# Altium footprint library Hydra_Ref_pcb.PcbLib: 353 footprints (part 18 of 23)
Each footprint in its own frame and in the unit in brackets; x right, y up, seen from the top. Pads: shape width x height; smd on the part's side, far side on the other; paste and mask are expansions set on the pad; w line width, h text height; cw(c..) or ccw(c..) is an arc to the next point about the centre after c.
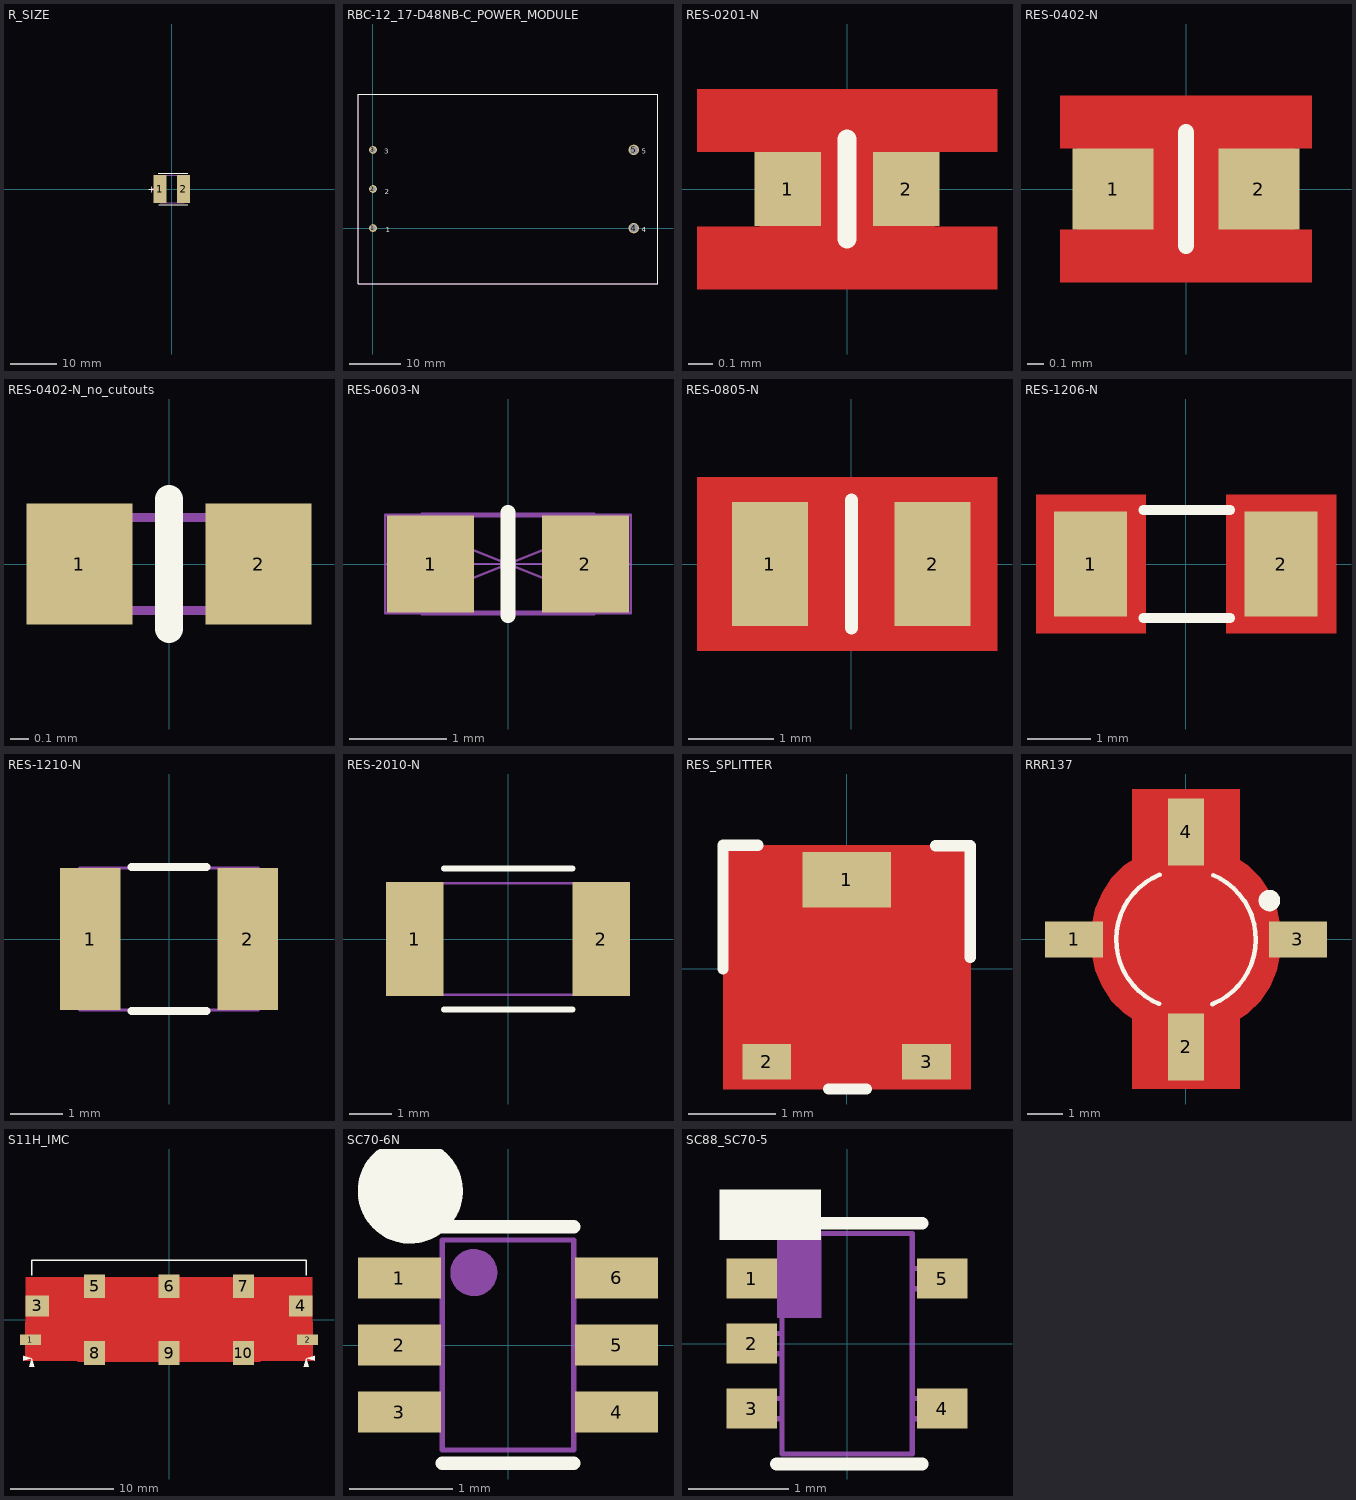
[diagram p17: the footprints below, top view; thin cyan lines are the x and y axes]

## R_SIZE [mil] "TANT CHIP CAP .283x.235x.148 R CASE CODE VISHAY"
height 150
pads (2):
  rect 110x240 smd: 1(-100,0) 2(100,0)
Top Overlay:
  lines w8: -115,132 135,132 ; -112.5,-132 135,-132
  text "+" at -205,-30 h60
9 Top Assy:
  lines w5: -98.15,-118.11 106.3,-118.11 ; -98.15,-118.05 -121.19,-5 -165.35,-5 -165.35,5 -121.73,5 -98.17,118.11 106.66,118.11 ; -78.38,-118.18 ccw(c-682.55,0) -78.35,118.02 ; 78.85,-118.09 cw(c658.22,0.05) 78.83,118.09 ; 106.66,-118.18 ccw(c-497.51,0) 106.66,118.18
  text "+" at -163.39,9.84 h60
  text ".Designator" at 21.65,-106.3 h60
3D body: height 150, standoff 0, extent -180,-140 180,140
3D body: height 80, standoff 50, extent -197.28,-20.16 -177.17,19.68

## RBC-12_17-D48NB-C_POWER_MODULE [mil] "RBC-12/17-D48NB-C"
height 137.8
pads (5):
  round 60 hole 40: 1(0,0) 2(0,300) 3(0,600)
  round 80 hole 60: 4(2000,0) 5(2000,600)
Top Overlay:
  lines w3: -115,-425 -115,1025 2186,1025 2186,-425 247.75,-425 -115,-425
  text "3" at 86,569 h39.37
  text "4" at 2060,-32 h39.37
  text "5" at 2060,569 h39.37
  text "2" at 92,258 h39.37
  text "1" at 97,-32 h39.37
9 Top Assy:
  lines w3: -115,-425 2186,-425 2186,1025 -115,1025 -115,-425
  text ".Designator" at 693,251 h39.37
13 Top 3D Bodies:
  lines w3: -115,-425 2186,-425 2186,1025 -115,1025 -115,-425
3D body: height 35.65, standoff 0, extent -115,-426 2183,1025

## RES-0201-N [mm] "Metric 1005"
height 0.305
pads (2):
  rect 0.27x0.3 smd mask+0.051: 1(-0.24,0) 2(0.24,0)
Top Layer:
  pour cut-out: -0.61,0.406 0.61,0.406 0.61,0.152 0.356,0.152 0.356,-0.152 0.61,-0.152 0.61,-0.406 -0.61,-0.406 -0.61,-0.152 -0.356,-0.152 -0.356,0.152 -0.61,0.152
Top Overlay:
  lines w0.076: 0,-0.203 0,0.203
Top Solder:
  rectangle: -0.24,-0.201 0.24,0.201
9 Top Assy:
  lines w0.038: -0.305,-0.152 0.305,-0.152 0.305,0.152 -0.305,0.152 -0.305,-0.152
  text ".Designator" at -0.254,-0.076 h0.15
3D body: height 0.61, standoff 0.01, extent -0.305,-0.152 0.305,0.152

## RES-0402-N [mil]
height 34
pads (2):
  rect 20x20 smd mask+2: 1(-18,0) 2(18,0)
Top Layer:
  pour cut-out: -31,23 31,23 31,10 27,10 27,-10 31,-10 31,-23 -31,-23 -31,-10 -27,-10 -27,10 -31,10
Top Overlay:
  lines w4: 0,-14 0,14
Top Solder:
  pour cut-out: -37,19 37,19 37,-19 -37,-19
9 Top Assy:
  lines w2: -20,-10 20,-10 20,10 -20,10 -20,-10
  text ".Designator" at -31,23 h10
3D body: height 33.07, standoff 0.39, extent -20,-10 20,10

## RES-0402-N_no_cutouts [mm]
height 0.864
pads (2):
  rect 0.58x0.66 smd: 1(-0.49,0) 2(0.49,0)
Top Overlay:
  lines w0.152: 0,-0.356 0,0.356
9 Top Assy:
  lines w0.051: -0.508,-0.254 0.508,-0.254 0.508,0.254 -0.508,0.254 -0.508,-0.254
  text ".Designator" at -0.45,-0.139 h0.25
3D body: height 0.84, standoff 0.01, extent -1,-0.55 1,0.55

## RES-0603-N [mm]
height 0.84
pads (2):
  rect 0.9x1 smd: 1(-0.8,0) 2(0.8,0)
Top Overlay:
  lines w0.152: 0,-0.533 0,0.533
Top Solder:
  pour cut-out: -1.549,0.787 1.549,0.787 1.549,-0.787 -1.549,-0.787
9 Top Assy:
  lines w0.051: -0.889,-0.508 -0.889,0.508 0.889,0.508 0.889,-0.508 -0.889,-0.508
  text ".Designator" at -0.826,-0.2 h0.47
22 Part Dimentions & Info:
  lines w0.025: -1.27,0 1.27,0 ; -0.826,-0.508 -0.826,0.508 ; 0,-0.508 0,0.508 ; 0.826,-0.508 0.826,0.508 ; -1.27,-0.508 1.27,0.508 ; -1.27,-0.508 -1.27,0.508 ; -1.27,-0.508 1.27,-0.508 ; -1.27,0.508 1.27,-0.508 ; -1.27,0.508 1.27,0.508 ; 1.27,-0.508 1.27,0.508
3D body: height 0.84, standoff 0, extent -0.888,-0.507 0.888,0.507

## RES-0805-N [mm]
height 0.711
pads (2):
  rect 0.889x1.45 smd: 1(-0.95,0) 2(0.95,0)
Top Layer:
  pour cut-out: -1.803,1.016 1.703,1.016 1.703,-1.016 -1.803,-1.016
Top Overlay:
  lines w0.152: 0,-0.75 0,0.75
9 Top Assy:
  lines w0.051: -1.016,-0.762 1.016,-0.762 1.016,0.762 -1.016,0.762 -1.016,-0.762
  text ".Designator" at -0.889,-0.254 h0.51
22 Part Dimentions & Info:
  lines w0.025: -1.524,0 1.524,0 ; -1.016,-0.762 -1.016,0.762 ; 0,-0.762 0,0.762 ; 1.016,-0.762 1.016,0.762 ; -1.524,-0.762 1.524,0.762 ; -1.524,-0.762 1.524,-0.762 ; -1.524,-0.762 -1.524,0.762 ; -1.524,0.762 1.524,-0.762 ; -1.524,0.762 1.524,0.762 ; 1.524,-0.762 1.524,0.762
3D body: height 0.7, standoff 0.01, extent -1.016,-0.762 1.016,0.762

## RES-1206-N [mm] "METRIC 3225"
height 1.7
pads (2):
  rect 1.15x1.65 smd: 1(-1.5,0) 2(1.5,0)
Top Layer:
  pour cut-out: 0.638,1.092 2.365,1.092 2.365,-1.092 0.638,-1.092
  pour cut-out: -2.362,1.092 -0.635,1.092 -0.635,-1.092 -2.362,-1.092
Top Overlay:
  lines w0.152: -0.67,-0.85 0.7,-0.85 ; -0.67,0.85 0.7,0.85
9 Top Assy:
  lines w0.051: -1.7,-0.8 1.7,-0.8 1.7,0.8 -1.7,0.8 -1.7,-0.8
  text ".Designator" at -1.5,-0.4 h0.71
3D body: height 0.64, standoff 0.01, extent -1.7,-0.8 1.7,0.8

## RES-1210-N [mm] "METRIC 3225"
height 0.7
pads (2):
  rect 1.15x2.7 smd: 1(-1.5,0) 2(1.5,0)
Top Overlay:
  lines w0.152: -0.711,-1.372 0.711,-1.372 ; -0.711,1.372 0.711,1.372
9 Top Assy:
  lines w0.051: -1.7,-1.35 -1.7,1.35 1.7,1.35 1.7,-1.35 -1.7,-1.35
  text ".Designator" at -1.5,-0.4 h0.81
3D body: height 0.7, standoff 0, extent -1.699,-1.349 1.699,1.349

## RES-2010-N [mil]
height 28
pads (2):
  rect 54x106.3 smd: 1(-87.5,0) 2(87,0)
Top Overlay:
  lines w6: -60,-66 60,-66 ; -60,66 60,66
Top Solder:
  pour cut-out: -126,65 125,65 125,-65 -126,-65
9 Top Assy:
  lines w2: -101.38,-52.17 -101.38,52.17 101.38,52.17 101.38,-52.17 -101.38,-52.17
  text ".Designator" at -50,-10 h25
3D body: height 24.02, standoff 0, extent -101.38,-52.17 101.38,52.17

## RES_SPLITTER [mil] "IPS2541; 98 X98 MIL"
height 20
pads (3):
  rect 40x25 smd: 1(0,40)
  rect 22x16 smd: 2(-36,-42) 3(36,-42)
Top Layer:
  region: 47,-16.46 46.54,-16 38,-16 25,-35 25,-49 47,-49
  region: -47,-16.46 -46.54,-16 -38,-16 -25,-35 -25,-49 -47,-49
  pour cut-out: -55.7,55.66 56,55.66 56,-54.2 -55.7,-54.2
Top Overlay:
  lines w5: -55.7,0 -55.7,55.66 -40,55.66 ; -8.18,-54.2 8.93,-54.2 ; 40,55.41 55.69,55.41 55.69,5
Top Paste:
  region: 47,-16.46 46.54,-16 38,-16 25,-35 25,-49 47,-49
  region: -47,-16.46 -46.54,-16 -38,-16 -25,-35 -25,-49 -47,-49
Top Solder:
  rectangle: -51,-54 51,57
  rectangle: -30,64 30,81
9 Top Assy:
  lines w2: -27.53,-48.8 -27.53,-40 -40,-19 -44.53,-19 ; -14,49 -14,31 14,31 14,49 ; 27.53,-48.8 27.53,-40 40,-19 44.53,-19 ; -44.53,-19 -44.53,-48.8 -44.53,-19 ; 44.53,-19 44.53,-48.8 44.53,-19 ; -49,-49 -49,49 49,49 49,-49 -49,-49
  text ".Designator" at -38,-5 h20
3D body: height 20, standoff 0.39, extent -49,-49 49,49

## RRR137 [mil]
height 76
pads (4):
  rect 65x40 smd: 1(-125,0) 3(125,0)
  rect 40x75 smd: 2(0,-120) 4(0,120)
Top Layer:
  rectangle: -20,-157 20,157
  region: 0,73 12,72 23,69 37,63 49,54 60,42 60,-42 52,-52 40,-61 26,-68 10,-72 -8,-72 -23.76,-69 -38,-62 -52,-52 -60,-41 -60,42 -51,52 -41,61 -27,68 -15,71 -1,73
  pour cut-out: 5.31,105 15.16,105 34.48,101.16 52.68,93.62 69.06,82.68 82.99,68.75 93.93,52.37 101.47,34.17 105.31,14.85 105.31,5 105.31,-5 105.31,-14.85 101.47,-34.17 93.93,-52.36 82.99,-68.74 69.06,-82.67 52.68,-93.62 34.48,-101.15 15.16,-105 5.31,-105 -5,-105 -14.85,-105 -34.17,-101.15 -52.36,-93.62 -68.74,-82.67 -82.67,-68.74 -93.62,-52.36 -101.15,-34.17 -105,-14.85 -105,-5 -105,5 -105,14.85 -101.15,34.17 -93.62,52.37 -82.67,68.75 -68.74,82.68 -52.36,93.62 -34.17,101.16 -14.85,105 -5,105
  pour cut-out: 60,168 60,-167 -60,-167 -60,168
Top Overlay:
  circle w12: c93.15,43.46 r6
  lines w5: -30,-72 cw(c0,0) -29.21,72.32 ; 29.21,-72.32 ccw(c0,0) 30.21,71.92
9 Top Assy:
  circle w2: c0,0 r73
  circle w2: c45,0 r15
  lines w2: -102.5,-15 -102.5,15 ; -71,-15 -135,-15 -125,15 -71,15 ; -15,-102.5 15,-102.5 ; -15,-71 -15,-135 15,-135 15,-71 ; -15,71 -15,135 15,135 15,71 ; -15,102.5 15,102.5 ; 71,-15 135,-15 135,15 71,15 ; 102.5,-15 102.5,15
  text ".Designator" at 15,-60 h35
3D body: height 120, standoff 0, extent -85,-85 85,85

## S11H_IMC [mil] "IMC S11H, >=2800 MHz"
height 230
pads (10):
  rect 80x40 smd: 1(-530,-77.5) 2(530,-77.5)
  rect 90x80 smd: 3(-505,52.5) 4(505,52.5)
  rect 80x90 smd: 5(-285,127.5) 6(0,127.5) 7(285,127.5) 8(-285,-127.5) 9(0,-127.5) 10(285,-127.5)
Top Layer:
  rectangle: -550,-7.5 550,162.5
  rectangle: -350,-162.5 350,162.5
  pour cut-out: 550,-7 350,-7 350,-157.5 550,-157.5
  pour cut-out: -550,-7 -350,-7 -350,-157.5 -550,-157.5
Top Overlay:
  region: -525,-147.5 -535,-180 -515,-180
  region: -525,-147.5 -557.5,-137.5 -557.5,-157.5
  region: 525,-147.5 557.5,-157.5 557.5,-137.5
  region: 525,-147.5 515,-180 535,-180
  lines w5: -525,170 -525,227.5 525,227.5 525,170
Top Paste:
  region: -550,-7.5 -550,162.5 550,162.5 550,-7.5 350,-7.5 350,-162.5 -350,-162.5 -350,-7.5
Top Solder:
  region: -561.5,184 561.5,184 561.5,-21.5 574,-21.5 574,-184 -574,-184 -574,-21.5 -561.5,-21.5
  pour cut-out: -337,-184 -233,-184 -233,-71 -337,-71
  pour cut-out: -52,-184 52,-184 52,-71 -52,-71
  pour cut-out: 233,-184 337,-184 337,-71 233,-71
  pour cut-out: -448.5,0.5 -448.5,104.5 -561.5,104.5 -561.5,0.5
  pour cut-out: -233,184 -337,184 -337,71 -233,71
  pour cut-out: 52,184 -52,184 -52,71 52,71
  pour cut-out: 337,184 233,184 233,71 337,71
  pour cut-out: 448.5,104.5 448.5,0.5 561.5,0.5 561.5,104.5
9 Top Assy:
  lines w2: -525,20.5 ccw(c-525,52.5) -525,84.5 ; -317,147.5 ccw(c-285,147.5) -253,147.5 ; -32,147.5 ccw(c0,147.5) 32,147.5 ; 253,147.5 ccw(c285,147.5) 317,147.5 ; 525,20.5 cw(c525,52.5) 525,84.5 ; -525,-147.5 525,-147.5 525,147.5 -525,147.5 -525,-147.5
  text ".Designator" at -230,-15 h50
Mechanical 30:
  lines w2: -525,-95 -525,-60 -400,-60 -400,-95 -525,-95 ; -525,-19.5 -360,-19.5 -360,-147.5 -317,-147.5 cw(c-285,-147.5) -253,-147.5 -32,-147.5 cw(c0,-147.5) 32,-147.5 253,-147.5 cw(c285,-147.5) 317,-147.5 360,-147.5 360,-19.5 525,-19.5 525,20.5 cw(c525,52.5) 525,84.5 525,147.5 -525,147.5 -525,84.5 cw(c-525,52.5) -525,20.5 -525,-19.5 ; 400,-95 400,-60 525,-60 525,-95 400,-95
3D body: height 230, standoff 220.33, extent -479.98,-99.98 479.98,129.98
3D body: height 220.33, standoff 32, extent -495,-110 495,145
3D body: height 170.33, standoff 61, extent -490.03,-105.5 490,227.5
3D body: height 195.33, standoff 32, extent -465,-105.5 -351.62,227.5
3D body: height 195.14, standoff 145.33, extent -326.67,-105.5 -276.77,227.5
3D body: height 195.14, standoff 145.33, extent -163.33,-105.5 -113.43,227.5
3D body: height 195.14, standoff 145.33, extent 0,-105.5 49.9,227.5
3D body: height 195.14, standoff 145.33, extent 163.33,-105.5 213.23,227.5
3D body: height 195.14, standoff 145.33, extent 326.66,-105.5 376.56,227.5
3D body: height 195.14, standoff 145.33, extent -490,-105.5 -440.1,227.5
3D body: height 195.14, standoff 145.33, extent -376.57,-105.5 -326.67,227.5
3D body: height 195.14, standoff 145.33, extent -213.24,-105.5 -163.33,227.5
3D body: height 195.14, standoff 145.33, extent -49.9,-105.5 0,227.5
3D body: height 195.14, standoff 145.33, extent 113.43,-105.5 163.33,227.5
3D body: height 195.14, standoff 145.33, extent 276.76,-105.5 326.66,227.5
3D body: height 195.14, standoff 145.33, extent 440.1,-105.5 490,227.5
3D body: height 81.8, standoff 32, extent 440.1,-105.5 490,227.5
3D body: height 81.8, standoff 32, extent 276.76,-105.5 326.67,227.5
3D body: height 81.8, standoff 32, extent 113.43,-105.5 163.33,227.5
3D body: height 81.8, standoff 32, extent -49.9,-105.5 0,227.5
3D body: height 81.8, standoff 32, extent -213.24,-105.5 -163.33,227.5
3D body: height 81.8, standoff 32, extent -376.57,-105.5 -326.67,227.5
3D body: height 81.8, standoff 32, extent -490,-105.5 -440.1,227.5
3D body: height 81.8, standoff 32, extent 326.67,-105.5 376.57,227.5
3D body: height 81.8, standoff 32, extent 163.33,-105.5 213.23,227.5
3D body: height 81.8, standoff 32, extent 0,-105.5 49.9,227.5
3D body: height 81.8, standoff 32, extent -163.33,-105.5 -113.43,227.5
3D body: height 81.8, standoff 32, extent -326.67,-105.5 -276.76,227.5
3D body: height 195.33, standoff 32, extent -301.69,-105.49 -188.3,227.5
3D body: height 195.33, standoff 32, extent -138.35,-105.49 -24.97,227.5
3D body: height 195.33, standoff 32, extent 24.98,-105.49 138.37,227.5
3D body: height 195.33, standoff 32, extent 188.31,-105.49 301.7,227.5
3D body: height 195.33, standoff 32, extent 351.65,-105.49 465.03,227.5
3D body: height 32, standoff 1.35, extent -525.02,-147.52 525.02,147.52
3D body: height 1.35, standoff 0, extent 400.02,-94.98 524.98,-60.02
3D body: height 1.35, standoff 0, extent -525.02,-147.52 525.02,147.52
3D body: height 1.35, standoff 0, extent -524.98,-94.98 -400.02,-60.02

## S11H_IMC_PLN4-BOT_VIAS [mil] "Blind via perimeter pattern, max hole space 17mil"
via 227.5,7.48 diameter 25 hole 12
via 237.5,-217.5 diameter 25 hole 12
via 237.5,-245 diameter 25 hole 12
via 237.5,-272.5 diameter 25 hole 12
via 227.5,-21.02 diameter 25 hole 12
via 227.5,-49.52 diameter 25 hole 12
via 227.5,-78.02 diameter 25 hole 12
via 227.5,-106.52 diameter 25 hole 12
via 227.5,-135.02 diameter 25 hole 12
via 227.5,-163.52 diameter 25 hole 12
via 227.5,-192.02 diameter 25 hole 12
via 227.5,-867.79 diameter 25 hole 12
via 227.5,-896.29 diameter 25 hole 12
via 227.5,-924.79 diameter 25 hole 12
via 227.5,-953.29 diameter 25 hole 12
via 227.5,-981.79 diameter 25 hole 12
via 227.5,-1010.29 diameter 25 hole 12
via 227.5,-1038.79 diameter 25 hole 12
via 237.5,-787.31 diameter 25 hole 12
via 237.5,-814.81 diameter 25 hole 12
via 237.5,-842.31 diameter 25 hole 12
via 227.5,-1067.29 diameter 25 hole 12
via 237.5,-557.5 diameter 25 hole 12
via 237.5,-530 diameter 25 hole 12
via 237.5,-502.5 diameter 25 hole 12
via 227.5,-672.41 diameter 25 hole 12
via 227.5,-700.91 diameter 25 hole 12
via 227.5,-729.41 diameter 25 hole 12
via 227.5,-757.91 diameter 25 hole 12
via 227.5,-586.91 diameter 25 hole 12
via 227.5,-615.41 diameter 25 hole 12
via 227.5,-643.91 diameter 25 hole 12
via 227.5,-359.1 diameter 25 hole 12
via 227.5,-330.6 diameter 25 hole 12
via 227.5,-302.1 diameter 25 hole 12
via 227.5,-473.1 diameter 25 hole 12
via 227.5,-444.6 diameter 25 hole 12
via 227.5,-416.1 diameter 25 hole 12
via 227.5,-387.6 diameter 25 hole 12
via -72.5,-672.41 diameter 25 hole 12
via -72.5,-643.91 diameter 25 hole 12
via -72.5,-615.41 diameter 25 hole 12
via -72.5,-586.91 diameter 25 hole 12
via -72.5,-757.91 diameter 25 hole 12
via -72.5,-729.41 diameter 25 hole 12
via -72.5,-700.91 diameter 25 hole 12
via -72.5,-416.1 diameter 25 hole 12
via -72.5,-444.6 diameter 25 hole 12
via -72.5,-473.1 diameter 25 hole 12
via -72.5,-302.1 diameter 25 hole 12
via -72.5,-330.6 diameter 25 hole 12
via -72.5,-359.1 diameter 25 hole 12
via -72.5,-387.6 diameter 25 hole 12
via -82.5,-557.5 diameter 25 hole 12
via -82.5,-530 diameter 25 hole 12
via -82.5,-502.5 diameter 25 hole 12
via -82.5,-217.7 diameter 25 hole 12
via -82.5,-245.2 diameter 25 hole 12
via -82.5,-272.7 diameter 25 hole 12
via -72.5,-192.21 diameter 25 hole 12
via -72.5,-867.99 diameter 25 hole 12
via -82.5,-787.5 diameter 25 hole 12
via -82.5,-815 diameter 25 hole 12
via -82.5,-842.5 diameter 25 hole 12
via 198.5,-1067.29 diameter 25 hole 12
via 169.5,-1067.29 diameter 25 hole 12
via 140.5,-1067.29 diameter 25 hole 12
via 111.5,-1067.29 diameter 25 hole 12
via 82.5,-1067.29 diameter 25 hole 12
via 82.5,7.48 diameter 25 hole 12
via 111.5,7.48 diameter 25 hole 12
via 140.5,7.48 diameter 25 hole 12
via 169.5,7.48 diameter 25 hole 12
via 198.5,7.48 diameter 25 hole 12
via 82.5,-137.52 diameter 25 hole 12
via 82.5,-108.52 diameter 25 hole 12
via 82.5,-79.52 diameter 25 hole 12
via 82.5,-50.52 diameter 25 hole 12
via 82.5,-21.52 diameter 25 hole 12
via 72.5,-192.21 diameter 25 hole 12
via 43.5,-192.21 diameter 25 hole 12
via 14.5,-192.21 diameter 25 hole 12
via -14.5,-192.21 diameter 25 hole 12
via -43.5,-192.21 diameter 25 hole 12
via 82.5,-166.52 diameter 25 hole 12
via 82.5,-893.29 diameter 25 hole 12
via 82.5,-1038.29 diameter 25 hole 12
via 82.5,-1009.29 diameter 25 hole 12
via 82.5,-980.29 diameter 25 hole 12
via 82.5,-951.29 diameter 25 hole 12
via 82.5,-922.29 diameter 25 hole 12
via -43.5,-867.6 diameter 25 hole 12
via -14.5,-867.6 diameter 25 hole 12
via 14.5,-867.6 diameter 25 hole 12
via 43.5,-867.6 diameter 25 hole 12
via 72.5,-867.6 diameter 25 hole 12

## SC70-6N [mm] "Ultra Small SC-70 package"
height 1.092
pads (6):
  rect 0.8x0.4 smd: 1(-1.05,0.648) 2(-1.05,0) 3(-1.05,-0.648) 4(1.05,-0.648) 5(1.05,0) 6(1.05,0.648)
Top Overlay:
  circle w0.508: c-0.945,1.488 r0.254
  lines w0.127: -0.635,-1.143 0.635,-1.143 ; -0.635,1.143 0.635,1.143
9 Top Assy:
  circle w0.254: c-0.33,0.7 r0.1
  lines w0.051: -0.635,-0.749 -1.016,-0.749 ; -0.635,-0.546 -1.016,-0.546 ; -0.635,-0.102 -1.016,-0.102 ; -0.635,0.102 -1.016,0.102 ; -0.635,0.546 -1.016,0.546 ; -0.635,0.749 -1.016,0.749 ; 0.635,-0.749 1.016,-0.749 ; 0.635,-0.546 1.016,-0.546 ; 0.635,-0.102 1.016,-0.102 ; 0.635,0.102 1.016,0.102 ; 0.635,0.546 1.016,0.546 ; 0.635,0.749 1.016,0.749 ; -1.016,-0.749 -1.016,-0.546 ; -1.016,-0.749 -0.813,-0.546 -0.813,-0.749 -1.016,-0.546 ; -1.016,-0.102 -1.016,0.102 ; -1.016,-0.102 -0.813,0.102 -0.813,-0.102 -1.016,0.102 ; -1.016,0.546 -1.016,0.749 ; -1.016,0.546 -0.813,0.749 -0.813,0.546 -1.016,0.749 ; 1.016,-0.749 1.016,-0.546 ; 1.016,-0.749 0.813,-0.546 0.813,-0.749 1.016,-0.546 ; 1.016,-0.102 0.813,0.102 0.813,-0.102 1.016,0.102 ; 1.016,-0.102 1.016,0.102 ; 1.016,0.546 1.016,0.749 ; 1.016,0.546 0.813,0.749 0.813,0.546 1.016,0.749 ; -0.635,-1.016 0.635,-1.016 0.635,1.016 -0.635,1.016 -0.635,-1.016
  text ".Designator" at 0.5,-0.9 h0.51
3D body: height 1.09, standoff 0.01, extent -1.778,-1.27 1.778,1.27

## SC88_SC70-5 [mm] "5Lead SC70, EIAJ SC88, 1.25mm wide"
height 1.1
pads (5):
  rect 0.5x0.4 smd: 1(-0.95,0.648) 2(-0.95,0) 3(-0.95,-0.648) 4(0.95,-0.648) 5(0.95,0.648)
Top Overlay:
  region: -0.258,1.031 -0.258,1.539 -1.27,1.539 -1.27,1.031
  lines w0.127: -0.75,1.2 0.75,1.2 ; -0.702,-1.2 0.75,-1.2
9 Top Assy:
  rectangle: -0.7,0.254 -0.254,1.1
  lines w0.051: -0.828,-0.749 -0.828,-0.545 ; -0.828,-0.101 -0.828,0.102 ; -0.828,0.547 -0.828,0.75 ; -0.65,-0.749 -1.05,-0.749 -1.05,-0.545 -0.65,-0.545 ; -0.65,-0.101 -1.05,-0.101 -1.05,0.102 -0.65,0.102 ; -0.65,0.547 -1.05,0.547 -1.05,0.75 -0.65,0.75 ; 0.65,-0.749 1.05,-0.749 1.05,-0.545 0.65,-0.545 ; 0.65,0.547 1.05,0.547 1.05,0.75 0.65,0.75 ; 0.828,-0.749 0.828,-0.545 ; 0.828,0.547 0.828,0.75 ; -0.65,-1.1 0.65,-1.1 0.65,1.1 -0.65,1.1 -0.65,-1.1
  text ".Designator" at 0.5,-1 h0.56
3D body: height 1.1, standoff 0, extent -0.649,-1.099 0.65,1.1